# Altium footprint library PCB Modules.PcbLib: 23 footprints (part 2 of 2)
Each footprint in its own frame and in the unit in brackets; x right, y up, seen from the top. Pads: shape width x height; smd on the part's side, far side on the other; paste and mask are expansions set on the pad; w line width, h text height; cw(c..) or ccw(c..) is an arc to the next point about the centre after c.
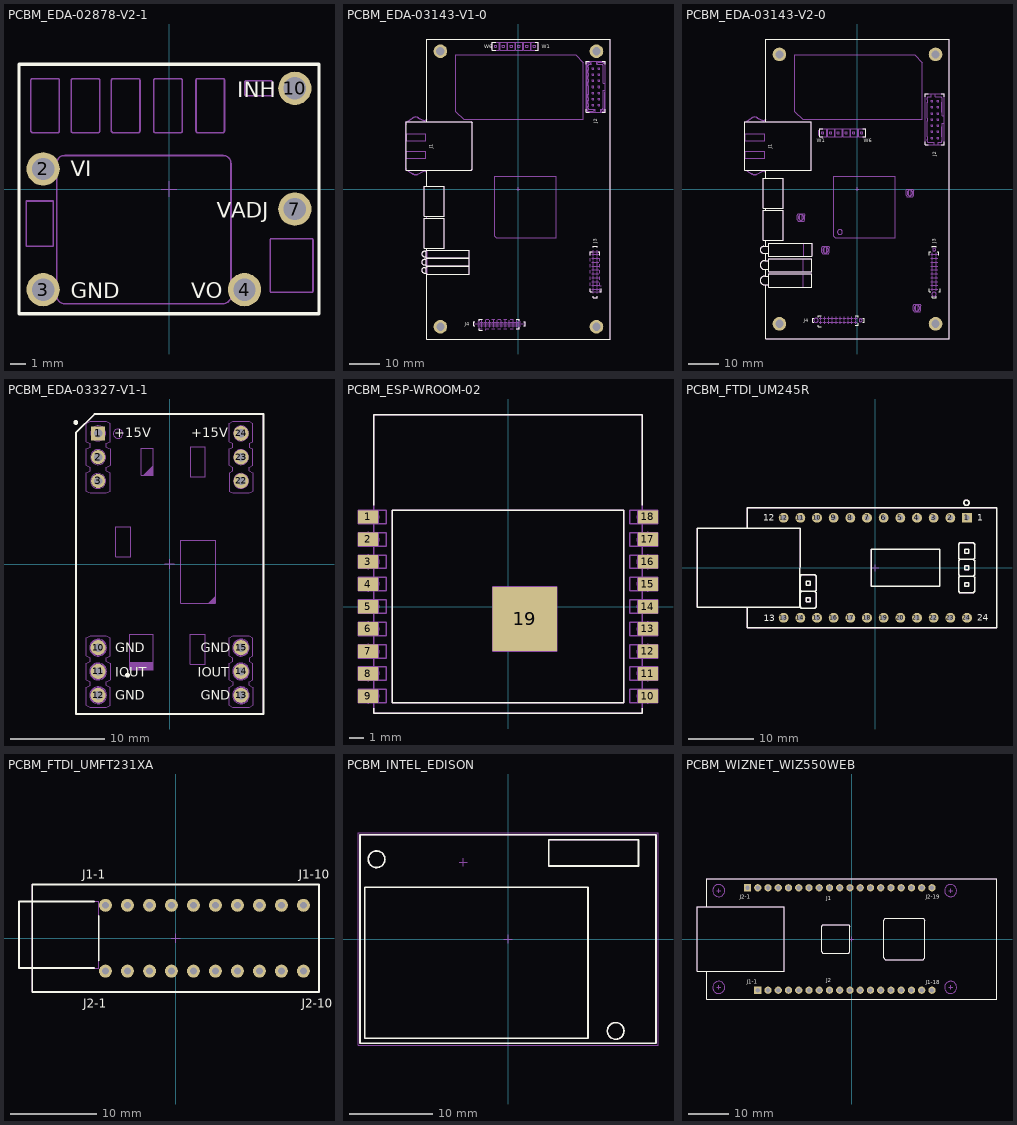
[diagram p1: the footprints below, top view; thin cyan lines are the x and y axes]

## PCBM_EDA-02878-V2-1 [mm] "TPS40303 DC/DC Converter Module"
height 5.5
pads (5):
  round 2.1 hole 1.4: 2(-7.938,1.27) 3(-7.938,-6.35) 4(4.763,-6.35) 7(7.938,-1.27) 10(7.938,6.35)
Top Overlay:
  lines w0.2: -9.462,-7.874 9.462,-7.874 9.462,7.874 -9.462,7.874 -9.462,-7.874
  text "VADJ" at 3,-1.8 h1
  text "GND" at -6.2,-6.9 h1
  text "VO" at 1.4,-6.9 h1
  text "INH" at 4.3,5.8 h1
  text "VI" at -6.2,0.8 h1
Mechanical 8:
  lines w0.05: -8.438,-6.35 -7.938,-6.35 -7.938,-6.85 ; -8.438,1.27 -7.938,1.27 -7.938,0.77 ; -0.5,0 0,0 ; 0,-0.5 0,0 ; 0,0.5 0,0 ; 0.5,0 0,0 ; 4.263,-6.35 4.763,-6.35 4.763,-6.85 ; 7.438,-1.27 7.938,-1.27 7.938,-1.77 ; 7.438,6.35 7.938,6.35 7.938,5.85
Mechanical 14:
  circle w0.1: c-7.938,1.27 r0.51
  circle w0.1: c7.938,6.35 r0.51
  circle w0.1: c7.938,-1.27 r0.51
  circle w0.1: c4.763,-6.35 r0.51
  circle w0.1: c-7.938,-6.35 r0.51
  lines w0.1: -9.462,-7.874 9.462,-7.874 9.462,7.874 -9.462,7.874 -9.462,-7.874 ; -9.014,-3.609 -7.314,-3.609 -7.314,-0.759 -9.014,-0.759 -9.014,-3.609 ; -8.711,3.658 ccw(c-8.611,3.658) -8.611,3.558 -7.011,3.558 ccw(c-7.011,3.658) -6.911,3.658 -6.911,6.858 ccw(c-7.011,6.858) -7.011,6.958 -8.611,6.958 ccw(c-8.611,6.858) -8.711,6.858 -8.711,3.658 ; -7.088,-6.736 ccw(c-6.588,-6.736) -6.588,-7.236 3.413,-7.236 ccw(c3.413,-6.736) 3.913,-6.736 3.913,1.614 ccw(c3.413,1.614) 3.413,2.114 -6.588,2.114 ccw(c-6.588,1.614) -7.088,1.614 -7.088,-6.736 ; -6.171,3.658 ccw(c-6.071,3.658) -6.071,3.558 -4.471,3.558 ccw(c-4.471,3.658) -4.371,3.658 -4.371,6.858 ccw(c-4.471,6.858) -4.471,6.958 -6.071,6.958 ccw(c-6.071,6.858) -6.171,6.858 -6.171,3.658 ; -3.631,3.658 ccw(c-3.531,3.658) -3.531,3.558 -1.931,3.558 ccw(c-1.931,3.658) -1.831,3.658 -1.831,6.858 ccw(c-1.931,6.858) -1.931,6.958 -3.531,6.958 ccw(c-3.531,6.858) -3.631,6.858 -3.631,3.658 ; -0.964,3.658 ccw(c-0.864,3.658) -0.864,3.558 0.736,3.558 ccw(c0.736,3.658) 0.836,3.658 0.836,6.858 ccw(c0.736,6.858) 0.736,6.958 -0.864,6.958 ccw(c-0.864,6.858) -0.964,6.858 -0.964,3.658 ; 1.703,3.658 ccw(c1.803,3.658) 1.803,3.558 3.403,3.558 ccw(c3.403,3.658) 3.503,3.658 3.503,6.858 ccw(c3.403,6.858) 3.403,6.958 1.803,6.958 ccw(c1.803,6.858) 1.703,6.858 1.703,3.658 ; 4.777,5.975 ccw(c4.877,5.975) 4.877,5.875 6.427,5.875 ccw(c6.427,5.975) 6.527,5.975 6.527,6.725 ccw(c6.427,6.725) 6.427,6.825 4.877,6.825 ccw(c4.877,6.725) 4.777,6.725 4.777,5.975 ; 6.384,-6.426 ccw(c6.484,-6.426) 6.484,-6.526 8.984,-6.526 ccw(c8.984,-6.426) 9.084,-6.426 9.084,-3.226 ccw(c8.984,-3.226) 8.984,-3.126 6.484,-3.126 ccw(c6.484,-3.226) 6.384,-3.226 6.384,-6.426
3D body "PCBM_EDA-02878-V2-1.stp": height 8.1, standoff -3.29, extent -9.461,-7.874 9.462,7.874

## PCBM_EDA-03143-V1-0 [mm] "\"CCD HVPS Controller\" Printed Circuit Board Module EDA-03143-V1"
height 20.41
pads (4):
  round 4.45 hole 2.7: MECH1(-25.5,45) MECH2(-25.479,-44.987) MECH3(25.481,-44.987) MECH4(25.481,44.993)
Top Overlay:
  lines w0.2: -30.041,-27.453 -30.663,-27.453 cw(c-30.663,-26.551) -30.663,-25.65 -30.041,-25.65 ; -30.041,-24.786 -30.663,-24.786 cw(c-30.663,-23.884) -30.663,-22.983 -30.041,-22.983 ; -30.041,-22.119 -30.663,-22.119 cw(c-30.663,-21.217) -30.663,-20.316 -30.041,-20.316 ; -29.979,-27.743 -29.979,-48.993 29.979,-48.993 29.979,48.993 -29.979,48.993 -29.979,22.029 ; -29.979,-25.355 -29.979,-25.076 ; -29.979,-22.688 -29.979,-22.409 ; -29.979,-20.021 -29.979,-19.386 ; -29.979,0.828 -29.979,6.149 ; -29.838,-27.796 -16.122,-27.796 -16.122,-25.307 -29.838,-25.307 ; -29.838,-27.743 -30.041,-27.743 -30.041,-25.355 -29.838,-25.355 ; -29.838,-25.129 -16.122,-25.129 -16.122,-22.64 -29.838,-22.64 ; -29.838,-25.076 -30.041,-25.076 -30.041,-22.688 -29.838,-22.688 ; -29.838,-22.462 -16.122,-22.462 -16.122,-19.973 -29.838,-19.973 ; -29.838,-22.409 -30.041,-22.409 -30.041,-20.021 -29.838,-20.021 ; -14.241,-44.728 -14.616,-44.728 -14.616,-43.428 -14.241,-43.428 ; -12.741,-45.628 -12.741,-46.128 -11.741,-46.128 ; -12.741,-43.078 -12.741,-42.528 -11.741,-42.528 ; -7.493,45.33 -8.493,45.33 -8.493,47.87 -7.493,47.87 ; -0.741,-45.628 0.309,-45.628 0.309,-45.078 ; -0.741,-42.528 0.309,-42.528 0.309,-43.078 ; 1.809,-44.728 2.184,-44.728 2.184,-43.428 1.809,-43.428 ; 5.484,45.33 6.484,45.33 6.484,47.87 5.484,47.87 ; 22.13,26.068 22.13,25.068 23.13,25.068 ; 22.13,40.718 22.13,41.718 23.13,41.718 ; 23.476,-32.584 23.476,-33.584 24.026,-33.584 ; 23.476,-21.584 23.476,-20.534 24.026,-20.534 ; 24.376,-35.084 24.376,-35.459 25.676,-35.459 25.676,-35.084 ; 24.376,-19.034 24.376,-18.659 25.676,-18.659 25.676,-19.034 ; 26.026,-20.534 26.576,-20.534 26.576,-21.584 ; 26.576,-33.584 27.076,-33.584 27.076,-32.584 ; 27.43,25.068 28.43,25.068 28.43,26.068 ; 27.43,41.718 28.43,41.718 28.43,40.718 ; -36.701,6.157 -36.701,22.029 -15.461,22.029 -15.111,21.679 -15.111,6.499 -15.453,6.157 -36.701,6.157 ; -30.805,-19.386 -30.805,-9.586 -24.165,-9.586 -24.165,-19.386 -30.805,-19.386 ; -30.805,-8.972 -30.805,0.828 -24.165,0.828 -24.165,-8.972 -30.805,-8.972
  text "W6" at -11.2,46 h1.2
  text "W1" at 7.6,45.9 h1.2
  text "J1" at -28,13.2 h1.2
  text "J4" at -17.5,-44.7 h1.2
  text "J3" at 25.6,-17.7 h1.2
  text "J2" at 25.8,21.4 h1.2
Mechanical 8:
  drawing of 180 lines, arcs and shapes, not listed
Mechanical 13:
  text "W6" at -11.2,46 h1.2
  text "W1" at 7.6,45.9 h1.2
  text "J1" at -28,13.2 h1.2
  text "J4" at -17.5,-44.7 h1.2
  text "J3" at 25.6,-17.7 h1.2
  text "J2" at 25.8,21.4 h1.2
Mechanical 14:
  drawing of 369 lines, arcs and shapes, not listed
3D body "PCBM_EDA-03143-V1-0.stp": height 21.34, standoff 0, extent -36.801,-48.992 29.979,48.993

## PCBM_EDA-03143-V2-0 [mm] "\"CCD HVPS Controller\" Printed Circuit Board Module EDA-03143-V2"
height 20.41
pads (4):
  round 4.45 hole 2.7: MECH1(-25.489,43.963) MECH2(-25.489,-44.037) MECH3(25.511,-44.037) MECH4(25.511,43.963)
Top Overlay:
  lines w0.2: -30.591,-18.73 -29.067,-18.73 ; -30.584,-18.73 ccw(c-30.591,-19.873) -30.591,-21.016 -29.067,-21.016 ; -29.979,-31.297 -29.979,-48.993 29.979,-48.993 29.979,48.993 -29.979,48.993 -29.979,22.029 ; -29.979,-28.452 -29.979,-26.287 ; -29.979,-23.442 -29.979,-21.016 ; -29.979,-18.73 -29.979,-16.719 ; -29.979,-6.919 -29.979,-6.305 ; -29.979,3.495 -29.979,6.149 ; -28.964,-30.065 -28.96,-30.065 ; -28.964,-29.684 -28.96,-29.684 ; -28.964,-25.055 -28.96,-25.055 ; -28.964,-24.674 -28.96,-24.674 ; -28.955,-23.442 -30.343,-23.442 ccw(c-30.343,-24.864) -30.343,-26.287 -28.953,-26.287 ; -28.943,-28.452 -30.343,-28.452 ccw(c-30.343,-29.874) -30.343,-31.297 -28.942,-31.297 ; -14.271,-43.55 -14.646,-43.55 -14.646,-42.25 -14.271,-42.25 ; -12.771,-44.45 -12.771,-44.95 -11.771,-44.95 ; -12.771,-41.9 -12.771,-41.35 -11.771,-41.35 ; -11.303,17.115 -12.303,17.115 -12.303,19.655 -11.303,19.655 ; -0.771,-44.45 0.279,-44.45 0.279,-43.9 ; -0.771,-41.35 0.279,-41.35 0.279,-41.9 ; 1.674,17.115 2.674,17.115 2.674,19.655 1.674,19.655 ; 1.779,-43.55 2.154,-43.55 2.154,-42.25 1.779,-42.25 ; 22.13,15.4 22.13,14.4 23.13,14.4 ; 22.13,30.05 22.13,31.05 23.13,31.05 ; 23.467,-32.584 23.467,-33.584 24.017,-33.584 ; 23.467,-21.584 23.467,-20.534 24.017,-20.534 ; 24.367,-35.084 24.367,-35.459 25.667,-35.459 25.667,-35.084 ; 24.367,-19.034 24.367,-18.659 25.667,-18.659 25.667,-19.034 ; 26.017,-20.534 26.567,-20.534 26.567,-21.584 ; 26.567,-33.584 27.067,-33.584 27.067,-32.584 ; 27.43,14.4 28.43,14.4 28.43,15.4 ; 27.43,31.05 28.43,31.05 28.43,30.05 ; -36.801,6.149 -15.111,6.149 -15.111,22.029 -36.801,22.029 -36.801,6.149 ; -30.805,-16.719 -30.805,-6.919 -24.165,-6.919 -24.165,-16.719 -30.805,-16.719 ; -30.805,-6.305 -30.805,3.495 -24.165,3.495 -24.165,-6.305 -30.805,-6.305 ; -29.067,-22.032 -14.843,-22.032 -14.843,-17.714 -29.067,-17.714 -29.067,-22.032 ; -28.953,-32.033 -28.953,-27.715 -14.874,-27.715 -14.874,-32.033 -28.953,-32.033 ; -28.953,-27.023 -28.953,-22.705 -14.874,-22.705 -14.874,-27.023 -28.953,-27.023
  text "J4" at -17.53,-43.522 h1.2
  text "J3" at 25.591,-17.7 h1.2
  text "J2" at 25.8,10.732 h1.2
  text "W6" at 2.09,15.285 h1.2
  text "W1" at -13.31,15.285 h1.2
  text "J1" at -28,13.2 h1.2
Mechanical 8:
  drawing of 180 lines, arcs and shapes, not listed
Mechanical 13:
  text "J4" at -17.53,-43.522 h1.2
  text "J3" at 25.591,-17.7 h1.2
  text "J2" at 25.8,10.732 h1.2
  text "W6" at 2.09,15.285 h1.2
  text "W1" at -13.31,15.285 h1.2
  text "J1" at -28,13.2 h1.2
Mechanical 14:
  drawing of 313 lines, arcs and shapes, not listed
3D body "PCBM_EDA-03143-V2-0.stp": height 21.34, standoff 0, extent -36.801,-48.992 29.979,48.993

## PCBM_EDA-03327-V1-1 [mm] "InterOut Current Source Module"
height 5.5
pads (12):
  rect 1.5x1.5 hole 0.9: 1(-7.619,13.936)
  round 1.5 hole 0.9: 2(-7.619,11.396) 3(-7.619,8.856)
  round 1.6 hole 0.9: 10(-7.619,-8.924) 11(-7.619,-11.464) 12(-7.619,-14.004) 13(7.621,-14.004) 14(7.621,-11.464) 15(7.621,-8.924) 22(7.621,8.856) 23(7.621,11.396) 24(7.621,13.936)
Top Overlay:
  circle w0.25: c-10,15.1 r0.125
  circle w0.25: c-4.485,-11.86 r0.125
  lines w0.2: -10,-16 -10,14 -8,16 10,16 10,-16 -10,-16
  text "IOUT" at -5.8,-12 h1
  text "IOUT" at 3,-12 h1
  text "GND" at 3.3,-14.48 h1
  text "GND" at 3.3,-9.4 h1
  text "GND" at -5.8,-14.48 h1
  text "GND" at -5.8,-9.4 h1
  text "+15V" at 2.3,13.5 h1
  text "+15V" at -5.9,13.5 h1
Mechanical 8:
  circle w0.05: c7.621,8.856 r0.45
  circle w0.05: c7.621,8.856 r0.8
  circle w0.05: c7.621,11.396 r0.45
  circle w0.05: c7.621,13.936 r0.45
  circle w0.05: c7.621,11.396 r0.8
  circle w0.05: c7.621,13.936 r0.8
  circle w0.05: c7.621,-14.004 r0.45
  circle w0.05: c7.621,-14.004 r0.8
  circle w0.05: c7.621,-11.464 r0.45
  circle w0.05: c7.621,-8.924 r0.45
  circle w0.05: c7.621,-11.464 r0.8
  circle w0.05: c7.621,-8.924 r0.8
  circle w0.05: c-7.619,-11.464 r0.45
  circle w0.05: c-7.619,-14.004 r0.8
  circle w0.05: c-7.619,-14.004 r0.45
  circle w0.05: c-7.619,-8.924 r0.45
  circle w0.05: c-7.619,-11.464 r0.8
  circle w0.05: c-7.619,-8.924 r0.8
  circle w0.05: c-7.619,11.396 r0.45
  circle w0.05: c-7.619,8.856 r0.8
  circle w0.05: c-7.619,8.856 r0.45
  circle w0.05: c-7.619,13.936 r0.45
  circle w0.05: c-7.619,11.396 r0.8
  circle w0.05: c-7.619,13.936 r0.8
  lines w0.05: -8.119,8.856 -7.619,8.856 ; -8.119,11.396 -7.619,11.396 ; -8.119,13.936 -7.619,13.936 ; -7.619,-13.504 -7.619,-14.004 ; -7.619,-10.964 -7.619,-11.464 ; -7.619,-8.424 -7.619,-8.924 ; -7.619,8.356 -7.619,8.856 ; -7.619,9.356 -7.619,8.856 ; -7.619,10.896 -7.619,11.396 ; -7.619,11.896 -7.619,11.396 ; -7.619,13.436 -7.619,13.936 ; -7.619,14.436 -7.619,13.936 ; -7.119,-14.004 -7.619,-14.004 ; -7.119,-11.464 -7.619,-11.464 ; -7.119,-8.924 -7.619,-8.924 ; -7.119,8.856 -7.619,8.856 ; -7.119,11.396 -7.619,11.396 ; -7.119,13.936 -7.619,13.936 ; -0.5,0 0,0 ; 0,-0.5 0,0 ; 0,0.5 0,0 ; 0.5,0 0,0 ; 7.121,-14.004 7.621,-14.004 ; 7.121,-11.464 7.621,-11.464 ; 7.121,-8.924 7.621,-8.924 ; 7.121,8.856 7.621,8.856 ; 7.121,11.396 7.621,11.396 ; 7.121,13.936 7.621,13.936 ; 7.621,-14.504 7.621,-14.004 ; 7.621,-13.504 7.621,-14.004 ; 7.621,-11.964 7.621,-11.464 ; 7.621,-10.964 7.621,-11.464 ; 7.621,-9.424 7.621,-8.924 ; 7.621,-8.424 7.621,-8.924 ; 7.621,8.356 7.621,8.856 ; 7.621,9.356 7.621,8.856 ; 7.621,10.896 7.621,11.396 ; 7.621,11.896 7.621,11.396 ; 7.621,13.436 7.621,13.936 ; 7.621,14.436 7.621,13.936 ; 8.121,-14.004 7.621,-14.004 ; 8.121,-11.464 7.621,-11.464 ; 8.121,-8.924 7.621,-8.924 ; 8.121,8.856 7.621,8.856 ; 8.121,11.396 7.621,11.396 ; 8.121,13.936 7.621,13.936 ; -7.619,-14.004 -7.619,-14.504 -7.619,-14.004 ; -7.619,-14.004 -8.119,-14.004 -7.619,-14.004 ; -7.619,-11.464 -7.619,-11.964 -7.619,-11.464 ; -7.619,-11.464 -8.119,-11.464 -7.619,-11.464 ; -7.619,-8.924 -7.619,-9.424 -7.619,-8.924 ; -7.619,-8.924 -8.119,-8.924 -7.619,-8.924
Mechanical 14:
  drawing of 175 lines, arcs and shapes, not listed
3D body "PCBM_EDA-03327-V1-1.stp": height 8.16, standoff -3.96, extent -10.001,-15.966 9.999,16.034

## PCBM_ESP-WROOM-02 [mm] "Module With ESP8266EX Wi-Fi SoC With Memory Controller Including SRAM And ROM"
height 3
pads (19):
  rect 1.35x0.9 smd: 1(-9.375,6) 2(-9.375,4.5) 3(-9.375,3) 4(-9.375,1.5) 5(-9.375,0) 6(-9.375,-1.5) 7(-9.375,-3) 8(-9.375,-4.5) 9(-9.375,-6) 10(9.375,-6) 11(9.375,-4.5) 12(9.375,-3) 13(9.375,-1.5) 14(9.375,0) 15(9.375,1.5) 16(9.375,3) 17(9.375,4.5) 18(9.375,6)
  rect 4.3x4.3 smd: 19(1.12,-0.83)
Top Overlay:
  lines w0.1: -9,-6.8 -9,-7.15 9,-7.15 9,-6.8 ; -9,6.8 -9,12.85 9,12.85 9,6.8 ; -7.75,-6.45 7.75,-6.45 7.75,6.45 -7.75,6.45 -7.75,-6.45
Mechanical 8:
  drawing of 157 lines, arcs and shapes, not listed
Mechanical 14:
  lines w0.1: -9,-6.45 -8.15,-6.45 -8.15,-5.55 -9,-5.55 ; -9,-4.95 -8.15,-4.95 -8.15,-4.05 -9,-4.05 ; -9,-3.45 -8.15,-3.45 -8.15,-2.55 -9,-2.55 ; -9,-1.95 -8.15,-1.95 -8.15,-1.05 -9,-1.05 ; -9,-0.45 -8.15,-0.45 -8.15,0.45 -9,0.45 ; -9,1.05 -8.15,1.05 -8.15,1.95 -9,1.95 ; -9,2.55 -8.15,2.55 -8.15,3.45 -9,3.45 ; -9,4.05 -8.15,4.05 -8.15,4.95 -9,4.95 ; -9,5.55 -8.15,5.55 -8.15,6.45 -9,6.45 ; 9,-6.45 8.15,-6.45 8.15,-5.55 9,-5.55 ; 9,-4.95 8.15,-4.95 8.15,-4.05 9,-4.05 ; 9,-3.45 8.15,-3.45 8.15,-2.55 9,-2.55 ; 9,-1.95 8.15,-1.95 8.15,-1.05 9,-1.05 ; 9,-0.45 8.15,-0.45 8.15,0.45 9,0.45 ; 9,1.05 8.15,1.05 8.15,1.95 9,1.95 ; 9,2.55 8.15,2.55 8.15,3.45 9,3.45 ; 9,4.05 8.15,4.05 8.15,4.95 9,4.95 ; 9,5.55 8.15,5.55 8.15,6.45 9,6.45 ; -9,-7.15 9,-7.15 9,-6.35 cw(c9,-6) 9,-5.65 9,-4.85 cw(c9,-4.5) 9,-4.15 9,-3.35 cw(c9,-3) 9,-2.65 9,-1.85 cw(c9,-1.5) 9,-1.15 9,-0.35 cw(c9,0) 9,0.35 9,1.15 cw(c9,1.5) 9,1.85 9,2.65 cw(c9,3) 9,3.35 9,4.15 cw(c9,4.5) 9,4.85 9,5.65 cw(c9,6) 9,6.35 9,12.85 -9,12.85 -9,6.35 cw(c-9,6) -9,5.65 -9,4.85 cw(c-9,4.5) -9,4.15 -9,3.35 cw(c-9,3) -9,2.65 -9,1.85 cw(c-9,1.5) -9,1.15 -9,0.35 cw(c-9,0) -9,-0.35 -9,-1.15 cw(c-9,-1.5) -9,-1.85 -9,-2.65 cw(c-9,-3) -9,-3.35 -9,-4.15 cw(c-9,-4.5) -9,-4.85 -9,-5.65 cw(c-9,-6) -9,-6.35 -9,-7.15 ; -7.75,-6.45 7.75,-6.45 7.75,6.45 -7.75,6.45 -7.75,-6.45
3D body "PCBM_ESP-WROOM-02.stp": height 3, standoff 0, extent -9,-7.15 9,12.85

## PCBM_FTDI_UM245R [mm] "Parallel FIFO Development Module"
height 16.5
pads (24):
  rect 1.5x1.5 hole 0.8: 1(13.97,7.62)
  round 1.5 hole 0.8: 2(11.43,7.62) 3(8.89,7.62) 4(6.35,7.62) 5(3.81,7.62) 6(1.27,7.62) 7(-1.27,7.62) 8(-3.81,7.62) 9(-6.35,7.62) 10(-8.89,7.62) 11(-11.43,7.62) 12(-13.97,7.62) 13(-13.97,-7.62) 14(-11.43,-7.62) 15(-8.89,-7.62) 16(-6.35,-7.62) 17(-3.81,-7.62) 18(-1.27,-7.62) 19(1.27,-7.62) 20(3.81,-7.62) 21(6.35,-7.62) 22(8.89,-7.62) 23(11.43,-7.62) 24(13.97,-7.62)
Top Overlay:
  circle w0.2: c13.892,9.906 r0.4
  lines w0.2: -19.558,-6.018 -19.558,-9.144 18.542,-9.144 18.542,9.144 -19.558,9.144 -19.558,6.018 ; -11.278,-3.59 -9.228,-3.59 ; -11.278,-3.59 -11.478,-3.79 -11.478,-5.93 -11.278,-6.13 -9.228,-6.13 -9.028,-5.93 -9.028,-3.79 -9.228,-3.59 ; -11.278,-3.59 -9.228,-3.59 ; -11.278,-3.59 -11.478,-3.39 -11.478,-1.25 -11.278,-1.05 -9.228,-1.05 -9.028,-1.25 -9.028,-3.39 -9.228,-3.59 ; 12.9,-1.27 14.95,-1.27 ; 12.9,-1.27 12.7,-1.47 12.7,-3.61 12.9,-3.81 14.95,-3.81 15.15,-3.61 15.15,-1.47 14.95,-1.27 ; 12.9,-1.27 14.95,-1.27 ; 12.9,-1.27 12.7,-1.07 12.7,1.07 12.9,1.27 ; 12.9,1.27 14.95,1.27 ; 12.9,1.27 14.95,1.27 ; 12.9,1.27 12.7,1.47 12.7,3.61 12.9,3.81 14.95,3.81 15.15,3.61 15.15,1.47 14.95,1.27 ; 14.95,-1.27 15.15,-1.07 15.15,1.07 14.95,1.27 ; -27.178,-6.018 -27.178,6.018 -11.478,6.018 -11.503,-6.018 -27.178,-6.018 ; -10.553,-5.16 -9.953,-5.16 -9.953,-4.56 -10.553,-4.56 -10.553,-5.16 ; -10.553,-2.62 -9.953,-2.62 -9.953,-2.02 -10.553,-2.02 -10.553,-2.62 ; -0.658,-2.8 -0.658,2.8 9.842,2.8 9.842,-2.8 -0.658,-2.8 ; 13.625,-2.84 14.225,-2.84 14.225,-2.24 13.625,-2.24 13.625,-2.84 ; 13.625,-0.3 14.225,-0.3 14.225,0.3 13.625,0.3 13.625,-0.3 ; 13.625,2.24 14.225,2.24 14.225,2.84 13.625,2.84 13.625,2.24
  text "1" at 15.567,7.165 h1
  text "12" at -17.1,7.15 h1
  text "24" at 15.5,-8.05 h1
  text "13" at -17,-8.15 h1
Mechanical 8:
  lines w0.1: -14.47,-7.62 -13.97,-7.62 ; -14.47,7.62 -13.97,7.62 ; -13.97,-8.12 -13.97,-7.62 ; -13.97,-7.12 -13.97,-7.62 ; -13.97,7.12 -13.97,7.62 ; -13.97,8.12 -13.97,7.62 ; -13.47,-7.62 -13.97,-7.62 ; -13.47,7.62 -13.97,7.62 ; -11.93,-7.62 -11.43,-7.62 ; -11.93,7.62 -11.43,7.62 ; -11.43,-8.12 -11.43,-7.62 ; -11.43,-7.12 -11.43,-7.62 ; -11.43,7.12 -11.43,7.62 ; -11.43,8.12 -11.43,7.62 ; -10.93,-7.62 -11.43,-7.62 ; -10.93,7.62 -11.43,7.62 ; -9.39,-7.62 -8.89,-7.62 ; -9.39,7.62 -8.89,7.62 ; -8.89,-8.12 -8.89,-7.62 ; -8.89,-7.12 -8.89,-7.62 ; -8.89,7.12 -8.89,7.62 ; -8.89,8.12 -8.89,7.62 ; -8.39,-7.62 -8.89,-7.62 ; -8.39,7.62 -8.89,7.62 ; -6.85,-7.62 -6.35,-7.62 ; -6.85,7.62 -6.35,7.62 ; -6.35,-8.12 -6.35,-7.62 ; -6.35,-7.12 -6.35,-7.62 ; -6.35,7.12 -6.35,7.62 ; -6.35,8.12 -6.35,7.62 ; -5.85,-7.62 -6.35,-7.62 ; -5.85,7.62 -6.35,7.62 ; -4.31,-7.62 -3.81,-7.62 ; -4.31,7.62 -3.81,7.62 ; -3.81,-8.12 -3.81,-7.62 ; -3.81,-7.12 -3.81,-7.62 ; -3.81,7.12 -3.81,7.62 ; -3.81,8.12 -3.81,7.62 ; -3.31,-7.62 -3.81,-7.62 ; -3.31,7.62 -3.81,7.62 ; -1.77,-7.62 -1.27,-7.62 ; -1.77,7.62 -1.27,7.62 ; -1.27,-8.12 -1.27,-7.62 ; -1.27,-7.12 -1.27,-7.62 ; -1.27,7.12 -1.27,7.62 ; -1.27,8.12 -1.27,7.62 ; -0.77,-7.62 -1.27,-7.62 ; -0.77,7.62 -1.27,7.62 ; -0.5,0 0,0 ; 0,-0.5 0,0 ; 0,0.5 0,0 ; 0.5,0 0,0 ; 0.77,-7.62 1.27,-7.62 ; 0.77,7.62 1.27,7.62 ; 1.27,-8.12 1.27,-7.62 ; 1.27,-7.12 1.27,-7.62 ; 1.27,7.12 1.27,7.62 ; 1.27,8.12 1.27,7.62 ; 1.77,-7.62 1.27,-7.62 ; 1.77,7.62 1.27,7.62 ; 3.31,-7.62 3.81,-7.62 ; 3.31,7.62 3.81,7.62 ; 3.81,-8.12 3.81,-7.62 ; 3.81,-7.12 3.81,-7.62 ; 3.81,7.12 3.81,7.62 ; 3.81,8.12 3.81,7.62 ; 4.31,-7.62 3.81,-7.62 ; 4.31,7.62 3.81,7.62 ; 5.85,-7.62 6.35,-7.62 ; 5.85,7.62 6.35,7.62 ; 6.35,-8.12 6.35,-7.62 ; 6.35,-7.12 6.35,-7.62 ; 6.35,7.12 6.35,7.62 ; 6.35,8.12 6.35,7.62 ; 6.85,-7.62 6.35,-7.62 ; 6.85,7.62 6.35,7.62 ; 8.39,-7.62 8.89,-7.62 ; 8.39,7.62 8.89,7.62 ; 8.89,-8.12 8.89,-7.62 ; 8.89,-7.12 8.89,-7.62 ; 8.89,7.12 8.89,7.62 ; 8.89,8.12 8.89,7.62 ; 9.39,-7.62 8.89,-7.62 ; 9.39,7.62 8.89,7.62 ; 10.93,-7.62 11.43,-7.62 ; 10.93,7.62 11.43,7.62 ; 11.43,-8.12 11.43,-7.62 ; 11.43,-7.12 11.43,-7.62 ; 11.43,7.12 11.43,7.62 ; 11.43,8.12 11.43,7.62 ; 11.93,-7.62 11.43,-7.62 ; 11.93,7.62 11.43,7.62 ; 13.47,-7.62 13.97,-7.62 ; 13.47,7.62 13.97,7.62 ; 13.97,-8.12 13.97,-7.62 ; 13.97,-7.12 13.97,-7.62 ; 13.97,7.12 13.97,7.62 ; 13.97,8.12 13.97,7.62 ; 14.47,-7.62 13.97,-7.62 ; 14.47,7.62 13.97,7.62
Mechanical 14:
  circle w0.1: c-13.97,7.62 r0.345
  circle w0.1: c-11.43,7.62 r0.345
  circle w0.1: c-8.89,7.62 r0.345
  circle w0.1: c-6.35,7.62 r0.345
  circle w0.1: c-3.81,7.62 r0.345
  circle w0.1: c-1.27,7.62 r0.345
  circle w0.1: c1.27,7.62 r0.345
  circle w0.1: c3.81,7.62 r0.345
  circle w0.1: c6.35,7.62 r0.345
  circle w0.1: c8.89,7.62 r0.345
  circle w0.1: c11.43,7.62 r0.345
  circle w0.1: c13.97,7.62 r0.345
  circle w0.1: c-13.97,-7.62 r0.345
  circle w0.1: c-11.43,-7.62 r0.345
  circle w0.1: c-8.89,-7.62 r0.345
  circle w0.1: c-6.35,-7.62 r0.345
  circle w0.1: c-3.81,-7.62 r0.345
  circle w0.1: c-1.27,-7.62 r0.345
  circle w0.1: c1.27,-7.62 r0.345
  circle w0.1: c3.81,-7.62 r0.345
  circle w0.1: c6.35,-7.62 r0.345
  circle w0.1: c8.89,-7.62 r0.345
  circle w0.1: c11.43,-7.62 r0.345
  circle w0.1: c13.97,-7.62 r0.345
  circle w0.1: c13.892,9.906 r0.4
  lines w0.1: -19.558,-6.018 -19.558,-9.144 18.542,-9.144 18.542,9.144 -19.558,9.144 -19.558,6.018 ; -11.278,-3.59 -9.228,-3.59 ; -11.278,-3.59 -11.478,-3.79 -11.478,-5.93 -11.278,-6.13 -9.228,-6.13 -9.028,-5.93 -9.028,-3.79 -9.228,-3.59 ; -11.278,-3.59 -9.228,-3.59 ; -11.278,-3.59 -11.478,-3.39 -11.478,-1.25 -11.278,-1.05 -9.228,-1.05 -9.028,-1.25 -9.028,-3.39 -9.228,-3.59 ; 12.9,-1.27 14.95,-1.27 ; 12.9,-1.27 12.7,-1.47 12.7,-3.61 12.9,-3.81 14.95,-3.81 15.15,-3.61 15.15,-1.47 14.95,-1.27 ; 12.9,-1.27 14.95,-1.27 ; 12.9,-1.27 12.7,-1.07 12.7,1.07 12.9,1.27 ; 12.9,1.27 14.95,1.27 ; 12.9,1.27 14.95,1.27 ; 12.9,1.27 12.7,1.47 12.7,3.61 12.9,3.81 14.95,3.81 15.15,3.61 15.15,1.47 14.95,1.27 ; 14.95,-1.27 15.15,-1.07 15.15,1.07 14.95,1.27 ; -27.178,-6.018 -27.178,6.018 -11.478,6.018 -11.503,-6.018 -27.178,-6.018 ; -10.553,-5.16 -9.953,-5.16 -9.953,-4.56 -10.553,-4.56 -10.553,-5.16 ; -10.553,-2.62 -9.953,-2.62 -9.953,-2.02 -10.553,-2.02 -10.553,-2.62 ; -0.658,-2.8 -0.658,2.8 9.842,2.8 9.842,-2.8 -0.658,-2.8 ; 13.625,-2.84 14.225,-2.84 14.225,-2.24 13.625,-2.24 13.625,-2.84 ; 13.625,-0.3 14.225,-0.3 14.225,0.3 13.625,0.3 13.625,-0.3 ; 13.625,2.24 14.225,2.24 14.225,2.84 13.625,2.84 13.625,2.24
  text "1" at 15.567,7.165 h1
  text "12" at -17.1,7.15 h1
  text "24" at 15.5,-8.05 h1
  text "13" at -17,-8.15 h1
3D body "PCBM_FTDI_UM245R.stp": height 16.47, standoff -3.08, extent -27.178,-9.144 18.542,9.144

## PCBM_FTDI_UMFT231XA [mm] "USB to Full-Handshake UART Development Module"
height 7.2
pads (20):
  round 1.5 hole 0.8: J1-1(-8.11,3.8) J1-2(-5.57,3.8) J1-3(-3.014,3.8) J1-4(-0.49,3.8) J1-5(2.05,3.8) J1-6(4.59,3.8) J1-7(7.13,3.8) J1-8(9.67,3.8) J1-9(12.21,3.8) J1-10(14.75,3.8) J2-1(-8.11,-3.8) J2-2(-5.57,-3.8) J2-3(-3.014,-3.8) J2-4(-0.49,-3.8) J2-5(2.05,-3.8) J2-6(4.59,-3.8) J2-7(7.13,-3.8) J2-8(9.67,-3.8) J2-9(12.21,-3.8) J2-10(14.75,-3.8)
Top Overlay:
  lines w0.2: -9.4,-3.45 -18.092,-3.45 -18.092,4.25 -9.4,4.25 ; -8.884,-2.6 -8.884,2.6 ; -16.55,-6.2 -16.55,6.2 16.55,6.2 16.55,-6.2 -16.55,-6.2
  text "J2-1" at -10.653,-8.055 h1
  text "J1-1" at -10.8,6.868 h1
  text "J1-10" at 14.2,6.868 h1
  text "J2-10" at 14.547,-8.055 h1
Mechanical 8:
  lines w0.05: -8.61,-3.8 -8.11,-3.8 ; -8.61,3.8 -8.11,3.8 ; -8.11,-4.3 -8.11,-3.8 ; -8.11,-3.3 -8.11,-3.8 ; -8.11,3.3 -8.11,3.8 ; -8.11,4.3 -8.11,3.8 ; -7.61,-3.8 -8.11,-3.8 ; -7.61,3.8 -8.11,3.8 ; -6.07,-3.8 -5.57,-3.8 ; -6.07,3.8 -5.57,3.8 ; -5.57,-4.3 -5.57,-3.8 ; -5.57,-3.3 -5.57,-3.8 ; -5.57,3.3 -5.57,3.8 ; -5.57,4.3 -5.57,3.8 ; -5.07,-3.8 -5.57,-3.8 ; -5.07,3.8 -5.57,3.8 ; -3.514,-3.8 -3.014,-3.8 ; -3.514,3.8 -3.014,3.8 ; -3.014,-4.3 -3.014,-3.8 ; -3.014,-3.3 -3.014,-3.8 ; -3.014,3.3 -3.014,3.8 ; -3.014,4.3 -3.014,3.8 ; -2.514,-3.8 -3.014,-3.8 ; -2.514,3.8 -3.014,3.8 ; -0.99,-3.8 -0.49,-3.8 ; -0.99,3.8 -0.49,3.8 ; -0.5,0 0,0 ; -0.49,-4.3 -0.49,-3.8 ; -0.49,-3.3 -0.49,-3.8 ; -0.49,3.3 -0.49,3.8 ; -0.49,4.3 -0.49,3.8 ; 0,-0.5 0,0 ; 0,0.5 0,0 ; 0.01,-3.8 -0.49,-3.8 ; 0.01,3.8 -0.49,3.8 ; 0.5,0 0,0 ; 1.55,-3.8 2.05,-3.8 ; 1.55,3.8 2.05,3.8 ; 2.05,-4.3 2.05,-3.8 ; 2.05,-3.3 2.05,-3.8 ; 2.05,3.3 2.05,3.8 ; 2.05,4.3 2.05,3.8 ; 2.55,-3.8 2.05,-3.8 ; 2.55,3.8 2.05,3.8 ; 4.09,-3.8 4.59,-3.8 ; 4.09,3.8 4.59,3.8 ; 4.59,-4.3 4.59,-3.8 ; 4.59,-3.3 4.59,-3.8 ; 4.59,3.3 4.59,3.8 ; 4.59,4.3 4.59,3.8 ; 5.09,-3.8 4.59,-3.8 ; 5.09,3.8 4.59,3.8 ; 6.63,-3.8 7.13,-3.8 ; 6.63,3.8 7.13,3.8 ; 7.13,-4.3 7.13,-3.8 ; 7.13,-3.3 7.13,-3.8 ; 7.13,3.3 7.13,3.8 ; 7.13,4.3 7.13,3.8 ; 7.63,-3.8 7.13,-3.8 ; 7.63,3.8 7.13,3.8 ; 9.17,-3.8 9.67,-3.8 ; 9.17,3.8 9.67,3.8 ; 9.67,-4.3 9.67,-3.8 ; 9.67,-3.3 9.67,-3.8 ; 9.67,3.3 9.67,3.8 ; 9.67,4.3 9.67,3.8 ; 10.17,-3.8 9.67,-3.8 ; 10.17,3.8 9.67,3.8 ; 11.71,-3.8 12.21,-3.8 ; 11.71,3.8 12.21,3.8 ; 12.21,-4.3 12.21,-3.8 ; 12.21,-3.3 12.21,-3.8 ; 12.21,3.3 12.21,3.8 ; 12.21,4.3 12.21,3.8 ; 12.71,-3.8 12.21,-3.8 ; 12.71,3.8 12.21,3.8 ; 14.25,-3.8 14.75,-3.8 ; 14.25,3.8 14.75,3.8 ; 14.75,-4.3 14.75,-3.8 ; 14.75,-3.3 14.75,-3.8 ; 14.75,3.3 14.75,3.8 ; 14.75,4.3 14.75,3.8 ; 15.25,-3.8 14.75,-3.8 ; 15.25,3.8 14.75,3.8
Mechanical 14:
  lines w0.1: -18.092,-3.45 -8.884,-3.45 -8.884,4.25 -18.092,4.25 -18.092,-3.45 ; -16.55,-6.2 -16.55,6.2 16.55,6.2 16.55,-6.2 -16.55,-6.2
  text "J2-1" at -10.653,-8.055 h1
  text "J1-1" at -11,6.668 h1
  text "J1-10" at 14,6.668 h1
  text "J2-10" at 14.547,-8.055 h1
3D body "PCBM_FTDI_UMFT231XA.stp": height 6.94, standoff -3, extent -18.092,-6.2 16.55,6.2

## PCBM_INTEL_EDISON [mm] "Processor and Processor Power Management IC, RAM, eMMC, and Wi-Fi/BT Module"
height 3.85
Top Overlay:
  circle w0.2: c-15.77,9.57 r1
  circle w0.2: c12.92,-11.03 r1
  lines w0.2: -17.75,-12.5 17.75,-12.5 17.75,12.5 -17.75,12.5 -17.75,-12.5 ; -17.2,-11.9 9.6,-11.9 9.6,6.21 -17.2,6.21 -17.2,-11.9 ; 4.87,8.755 4.87,11.905 15.67,11.905 15.67,8.755 4.87,8.755
Mechanical 8:
  lines w0.05: -5.88,9.2 -5.38,9.2 ; -5.38,8.7 -5.38,9.2 ; -5.38,9.7 -5.38,9.2 ; -4.88,9.2 -5.38,9.2 ; -0.5,0 0,0 ; 0,-0.5 0,0 ; 0,0.5 0,0 ; 0.5,0 0,0
Mechanical 14:
  circle w0.1: c-15.77,9.57 r1
  circle w0.1: c12.92,-11.03 r1
  lines w0.1: -17.75,-12.5 17.75,-12.5 17.75,12.5 -17.75,12.5 -17.75,-12.5 ; -17.2,-11.9 9.6,-11.9 9.6,6.21 -17.2,6.21 -17.2,-11.9 ; 4.87,8.755 4.87,11.905 15.67,11.905 15.67,8.755 4.87,8.755
Mechanical 15:
  lines w0.05: -18,-12.75 18,-12.75 18,12.75 -18,12.75 -18,-12.75
3D body "PCBM_INTEL_EDISON.stp": height 4.31, standoff 0.41, extent -17.75,-12.5 17.75,12.5

## PCBM_WIZNET_WIZ550WEB [mm] "Embedded Web Server Module base on W5500 TCP/IP Chip"
height 24.5
pads (37):
  rect 1.8x1.8 hole 1.1: J1-1(-23.32,-12.7) J2-1(-25.86,12.7)
  round 1.8 hole 1.1: J1-2(-20.78,-12.7) J1-3(-18.24,-12.7) J1-4(-15.7,-12.7) J1-5(-13.16,-12.7) J1-6(-10.62,-12.7) J1-7(-8.08,-12.7) J1-8(-5.54,-12.7) J1-9(-3,-12.7) J1-10(-0.46,-12.7) J1-11(2.08,-12.7) J1-12(4.62,-12.7) J1-13(7.16,-12.7) J1-14(9.7,-12.7) J1-15(12.24,-12.7) J1-16(14.78,-12.7) J1-17(17.32,-12.7) J1-18(19.86,-12.7) J2-2(-23.32,12.7) J2-3(-20.78,12.7) J2-4(-18.24,12.7) J2-5(-15.7,12.7) J2-6(-13.16,12.7) J2-7(-10.62,12.7) J2-8(-8.08,12.7) J2-9(-5.54,12.7) J2-10(-3,12.7) J2-11(-0.46,12.7) J2-12(2.08,12.7) J2-13(4.62,12.7) J2-14(7.16,12.7) J2-15(9.7,12.7) J2-16(12.24,12.7) J2-17(14.78,12.7) J2-18(17.32,12.7) J2-19(19.86,12.7)
Top Overlay:
  lines w0.2: -36,-7.94 -36,-15 36,-15 36,15 -36,15 -36,7.94 ; -38.39,-7.94 -38.39,7.94 -16.7,7.94 -16.7,-7.94 -38.39,-7.94 ; -7.5,-3.2 -7.5,3.2 -7.2,3.5 -0.8,3.5 -0.5,3.2 -0.5,-3.2 -0.8,-3.5 -7.2,-3.5 -7.5,-3.2 ; 7.9,-4.7 8.3,-5.1 17.7,-5.1 18.1,-4.7 18.1,4.7 17.7,5.1 8.3,5.1 7.9,4.7 7.9,-4.7
  text "J2-19" at 18.367,9.965 h1
  text "J1-1" at -26.033,-11.135 h1
  text "J2" at -6.333,-10.735 h1
  text "J1" at -6.333,9.565 h1
  text "J2-1" at -27.733,9.965 h1
  text "J1-18" at 18.367,-11.235 h1
Mechanical 8:
  drawing of 168 lines, arcs and shapes, not listed
Mechanical 14:
  circle w0.1: c24.5,-12 r1.5
  circle w0.1: c-33,-12 r1.5
  circle w0.1: c-33,12 r1.5
  circle w0.1: c24.5,12 r1.5
  lines w0.1: -36,-7.94 -36,-15 36,-15 36,15 -36,15 -36,7.94 ; -38.39,-7.94 -38.39,7.94 -16.7,7.94 -16.7,-7.94 -38.39,-7.94 ; -7.5,-3.2 -7.5,3.2 -7.2,3.5 -0.8,3.5 -0.5,3.2 -0.5,-3.2 -0.8,-3.5 -7.2,-3.5 -7.5,-3.2 ; 7.9,-4.7 8.3,-5.1 17.7,-5.1 18.1,-4.7 18.1,4.7 17.7,5.1 8.3,5.1 7.9,4.7 7.9,-4.7
  text "J2-19" at 18.367,9.965 h1
  text "J1-1" at -26.033,-11.135 h1
  text "J2" at -6.333,-10.735 h1
  text "J1" at -6.333,9.565 h1
  text "J2-1" at -27.733,9.965 h1
  text "J1-18" at 18.367,-11.235 h1
3D body "PCBM_WIZNET_WIZ550WEB.stp": height 18.43, standoff -7.5, extent -38.39,-15 36,15